# Altium footprint library BASIC.PcbLib: 244 footprints (part 13 of 16)
Each footprint in its own frame and in the unit in brackets; x right, y up, seen from the top. Pads: shape width x height; smd on the part's side, far side on the other; paste and mask are expansions set on the pad; w line width, h text height; cw(c..) or ccw(c..) is an arc to the next point about the centre after c.
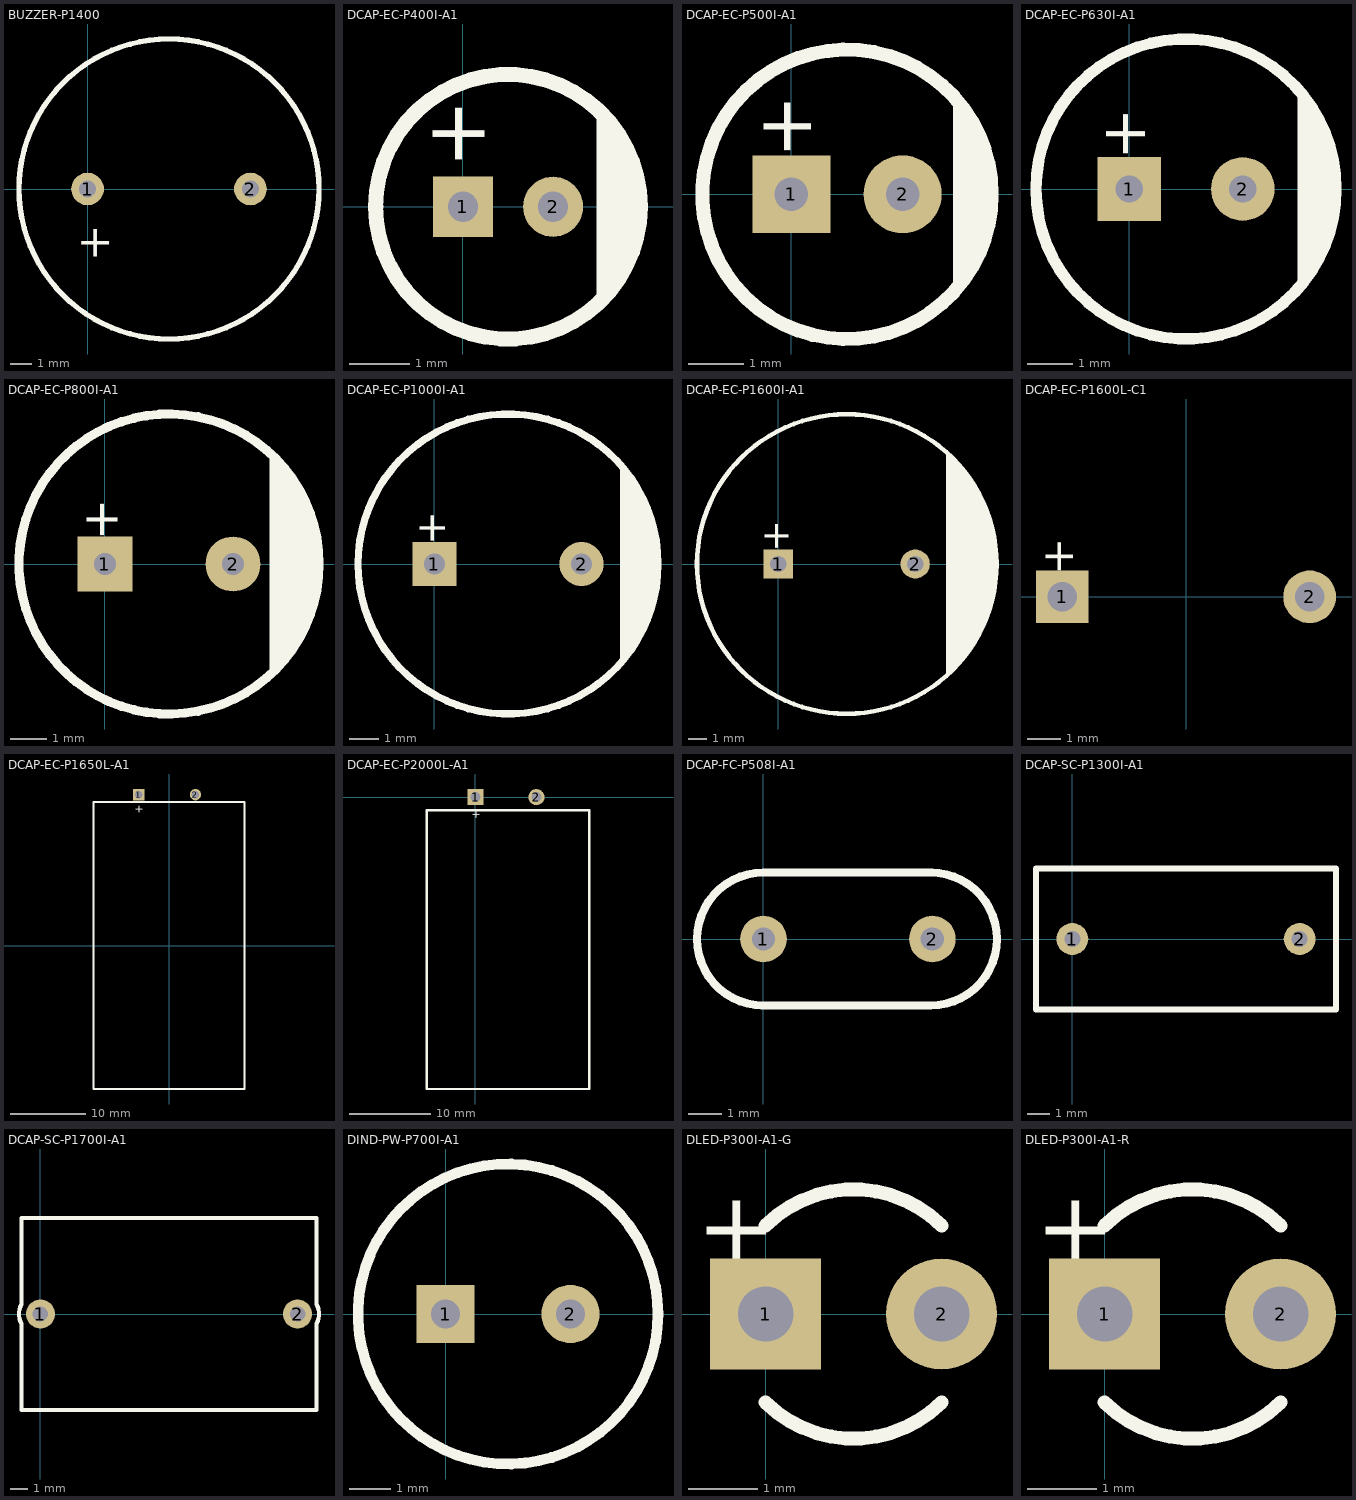
[diagram p12: the footprints below, top view; thin cyan lines are the x and y axes]

## BUZZER-P1400 [mil]
height 374.02
pads (2):
  round 60 hole 31.5: 1(0,0) 2(299.21,0)
Top Overlay:
  circle w9.84: c149.61,0 r275.59
  text "+" at -19.68,-124.02 h60
3D body "Buzzer14mm.STEP": height 289.37, standoff -122.05, extent -126.37,-275.58 424.81,275.6

## DCAP-EC-P400I-A1 [mm]
pads (2):
  rect 1x1 hole 0.5: 1(0.004,0)
  round 1 hole 0.5: 2(1.504,0)
Top Overlay:
  circle w0.25: c0.754,0 r2.2
  region: 2.354,-1.475 2.354,1.475 2.7,1.129 2.925,0.5 2.954,0 2.9,-0.45 2.775,-0.825
  lines w0.254: 2.354,-1.475 2.354,1.475
  text "+" at -0.496,1.79 h1
3D body "User Library-Cap-EL(4x6-1_5)T.STEP": height 6.3, standoff -3.3, extent -1.272,-1.948 2.73,2.043

## DCAP-EC-P500I-A1 [mm]
height 7
pads (2):
  rect 1.4x1.4 hole 0.6: 1(0,0)
  round 1.4 hole 0.6: 2(2,0)
Top Overlay:
  circle w0.25: c1,0 r2.6
  region: 2.95,1.72 2.95,-1.675 3.325,-1.275 3.5,-0.925 3.6,-0.6 3.6,0.4 3.525,0.825 3.35,1.2
  lines w0.1: 2.95,-1.8 2.95,1.75
  text "+" at -0.5,1.79 h1
3D body "CAP5x7.STEP": height 7.2, standoff -1.3, extent -1.499,-2.493 3.499,2.5

## DCAP-EC-P630I-A1 [mm]
height 11
pads (2):
  rect 1.4x1.4 hole 0.6: 1(0,0)
  round 1.4 hole 0.6: 2(2.5,0)
Top Overlay:
  circle w0.25: c1.25,0 r3.3
  region: 3.75,2.05 3.75,-2.15 4.15,-1.625 4.475,-0.7 4.55,0 4.475,0.775 4.25,1.35
  lines w0.1: 3.75,-2.15 3.75,2.05
  text "+" at -0.5,1.79 h1
3D body "User Library-Cap electrolitic radial 6,3x11.STEP": height 11.2, standoff -1.3, extent -1.879,-3.141 4.419,3.15

## DCAP-EC-P800I-A1 [mm]
height 12
pads (2):
  rect 1.5x1.5 hole 0.6: 1(0,0)
  round 1.5 hole 0.6: 2(3.5,0)
Top Overlay:
  circle w0.25: c1.75,0 r4.1
  region: 4.55,-2.995 4.55,2.96 5.25,2.26 5.675,1.175 5.85,0 5.8,-0.625 5.55,-1.5
  lines w0.1: 4.55,-3.04 4.55,2.96
  text "+" at -0.5,1.79 h1
3D body "User Library-Cap electrolitic radial 8x12.STEP": height 12.8, standoff -0.7, extent -2.269,-4.009 5.729,3.979

## DCAP-EC-P1000I-A1 [mm]
height 16
pads (2):
  rect 1.5x1.5 hole 0.7: 1(0,0)
  round 1.5 hole 0.7: 2(5,0)
Top Overlay:
  circle w0.25: c2.5,0 r5.1
  region: 6.35,3.24 6.35,-3.26 6.89,-2.632 7.225,-1.9 7.5,-1.3 7.5,1.325 7.225,1.95
  lines w0.1: 6.35,-3.26 6.35,3.24
  text "+" at -0.5,1.79 h1
3D body "CAP10x16.STEP": height 16.8, standoff -0.7, extent -2.498,-5.016 7.498,4.969

## DCAP-EC-P1600I-A1 [mm]
height 26
pads (2):
  rect 1.6x1.6 hole 0.9: 1(0,0)
  round 1.6 hole 0.9: 2(7.5,0)
Top Overlay:
  circle w0.25: c3.75,0 r8.2
  region: 9.32,5.92 9.32,-5.93 9.395,-5.93 10.725,-4.375 11.5,-2.65 11.825,-1.5 11.925,-0.9 11.977,-0.106 11.777,1.67 10.8,4.225
  lines w0.254: 9.32,-5.93 9.32,5.92
  text "+" at -0.75,2.4 h1.52
3D body "User Library-Cap electrolitic radial 16x26.STEP": height 26.8, standoff -0.7, extent -4.247,-7.953 11.747,8.023

## DCAP-EC-P1600L-C1 [mm]
pads (2):
  rect 1.6x1.6 hole 0.9: 1(-3.75,0)
  round 1.6 hole 0.9: 2(3.75,0)
Top Overlay:
  text "+" at -4.25,1.79 h1
3D body "User Library-Cap electrolitic radial 16x26.STEP": height 26.8, standoff -0.7, extent -7.997,-7.953 7.997,8.023

## DCAP-EC-P1650L-A1 [mm]
pads (2):
  rect 1.5x1.5 hole 1: 1(-4,20)
  round 1.5 hole 1: 2(3.5,20)
Top Overlay:
  lines w0.254: -10,-19 10,-19 10,19 -10,19 -10,-19
  text "+" at -3.5,17.5 h1
3D body "User Library-ElCap_16x31_5.STEP": height 20, standoff -2.59, extent -10.256,-16.172 9.744,20.328

## DCAP-EC-P2000L-A1 [mm]
pads (2):
  rect 2x2 hole 1.2: 1(0.003,-0.006)
  round 2 hole 1.2: 2(7.503,-0.006)
Top Overlay:
  lines w0.254: -5.997,-35.936 -5.997,-1.622 14.003,-1.622 14.003,-35.936 -5.997,-35.936
  text "+" at 0.5,-2.725 h1
3D body "User Library-ElCap_16x31_5.STEP": height 20, standoff -2.59, extent -6.174,-35.862 13.826,0.638

## DCAP-FC-P508I-A1 [mm]
height 10
pads (2):
  round 1.4 hole 0.7: 1(0,0) 2(5.08,0)
Top Overlay:
  lines w0.25: -0.055,-2 5.025,-2 ccw(c5.025,0) 5.025,2 ; 0,-2 cw(c0,0) 0,2 5.08,2
3D body "User Library-CAPS6mm.STEP": height 6.1, standoff -3, extent -0.398,-1.584 5.477,1.604

## DCAP-SC-P1300I-A1 [mm]
height 12
pads (2):
  round 1.4 hole 0.7: 1(0,0) 2(10,0)
Top Overlay:
  lines w0.25: -1.6,-3.1 -1.6,3.1 11.6,3.1 11.6,-3.1 -1.6,-3.1

## DCAP-SC-P1700I-A1 [mm] "AC電容"
height 19
pads (2):
  round 1.7 hole 0.9: 1(0,0) 2(15,0)
Top Overlay:
  lines w0.25: -1.1,-0.59 -1.1,-5.6 16.1,-5.6 16.1,-0.59 ; -1.1,0.59 -1.1,5.6 16.1,5.6 16.1,0.59
  lines w0.254: -1.105,0.585 ccw(c0,0) -1.103,-0.587 ; 16.103,0.587 cw(c15,0) 16.105,-0.585
3D body "安?": height 19.1, standoff -7.9, extent -1.04,-5.5 15.96,5.5

## DIND-PW-P700I-A1 [mm]
pads (2):
  rect 1.4x1.4 hole 0.7: 1(-0.005,0.001)
  round 1.4 hole 0.7: 2(2.995,0.001)
Top Overlay:
  circle w0.254: c1.495,0.001 r3.6
3D body "User Library-RLB 0712.STEP": height 10, standoff -25, extent -1.798,-3.326 4.902,3.374

## DLED-P300I-A1-G [mm]
height 5
pads (2):
  rect 1.6x1.6 hole 0.8: 1(0,0)
  round 1.6 hole 0.8: 2(2.54,0)
Top Overlay:
  lines w0.2: -0.003,-1.273 ccw(c1.27,0) 2.543,-1.273 ; -0.003,1.273 cw(c1.27,0) 2.543,1.273
  text "+" at -0.99,0.77 h1
3D body "User Library-LED_d3-GRN.STEP": height 4.98, standoff -2.5, extent -0.364,-1.663 2.85,1.634

## DLED-P300I-A1-R [mm]
pads (2):
  rect 1.6x1.6 hole 0.8: 1(0,0)
  round 1.6 hole 0.8: 2(2.54,0)
Top Overlay:
  lines w0.2: -0.003,-1.273 ccw(c1.27,0) 2.543,-1.273 ; -0.003,1.273 cw(c1.27,0) 2.543,1.273
  text "+" at -0.99,0.77 h1
3D body "User Library-LED_d3-RED.STEP": height 4.98, standoff -2.5, extent -0.364,-1.663 2.849,1.634